# Altium integrated library AnalogDevices.IntLib: 130 symbols (part 4 of 4)
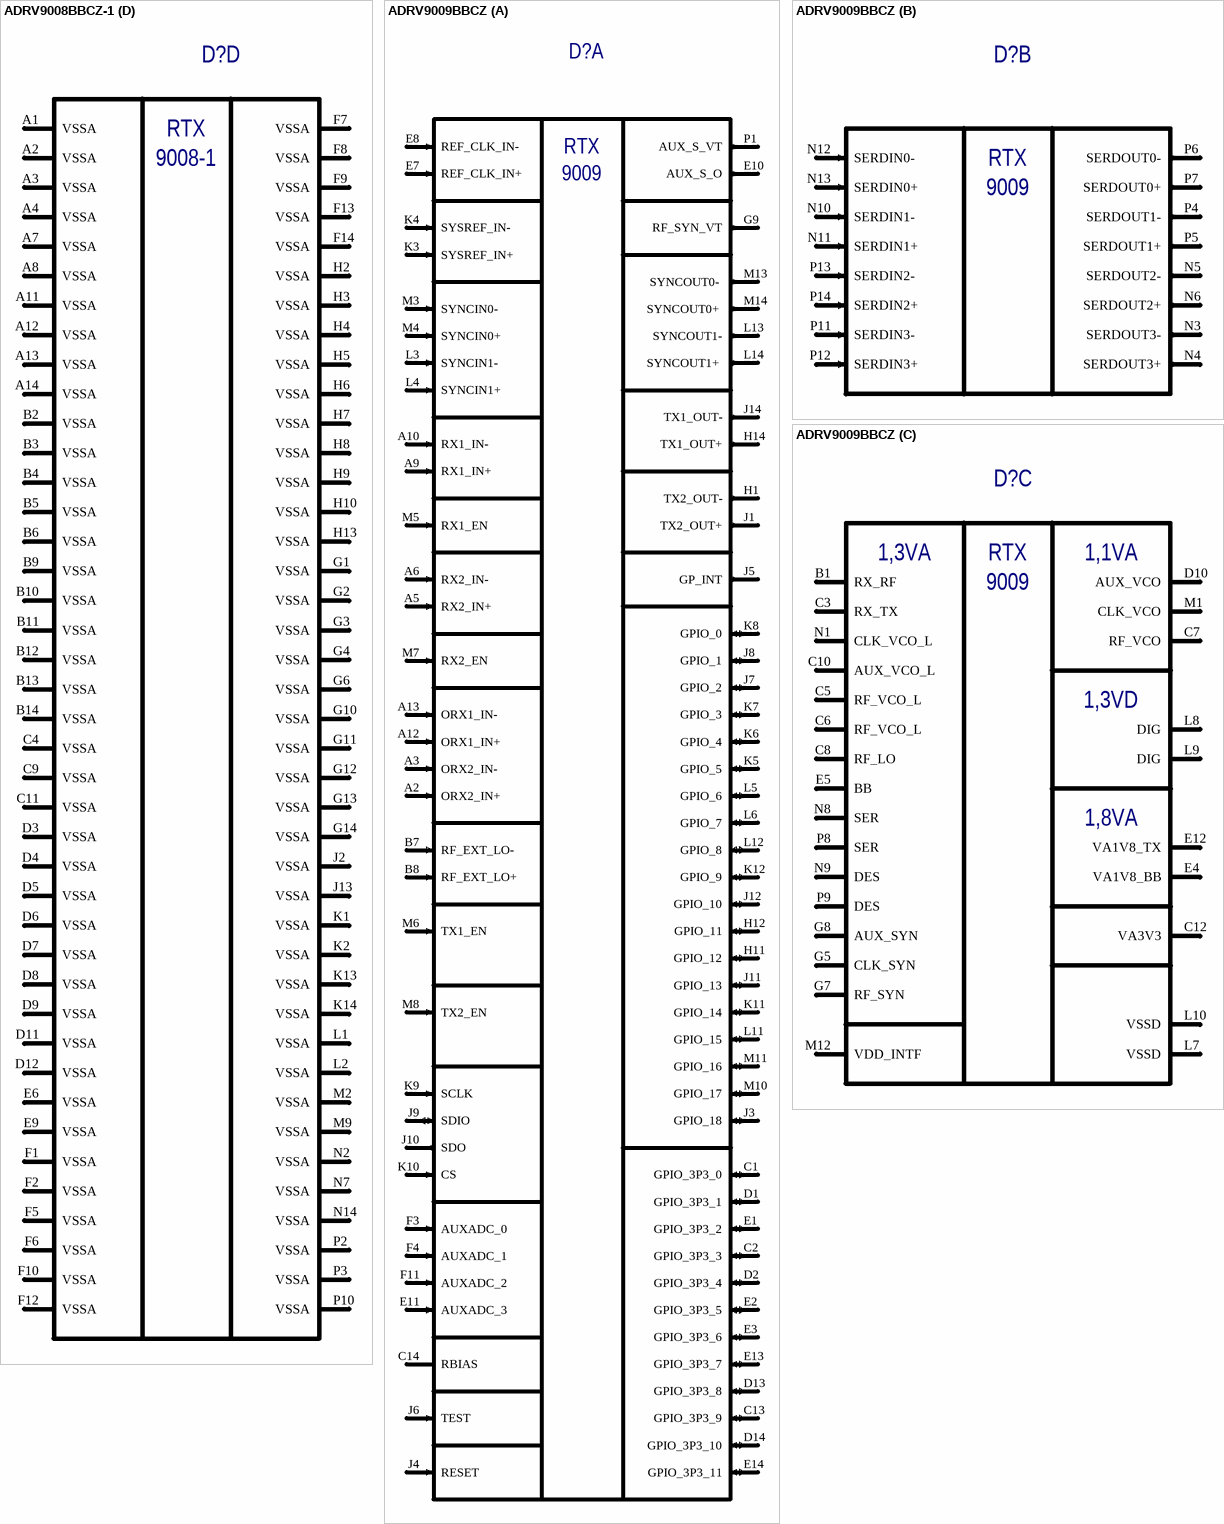
[diagram p24: symbols ADRV9008BBCZ-1 to ADRV9009BBCZ]

## ADRV9008BBCZ-1
designator D?  (value not drawn)
Integrated Dual RF Receivers; Manufacturer: Analog Devices; Type: Микросхема; SymAuthor: Ерешко П.А.; Package: BC-196-13; ManufacturerPartNumber: ADRV9008BBCZ-1
footprint BGA196C80P12X12_1200X1200X127 (BGA, 196-Leads, Body 12,00x12,00mmx1,27mm, Pitch 0,80mm)
part A pins: A5 RX2_IN+ (in) "Differential Input for Main Receiver 2.", A6 RX2_IN- (in) "Differential Input for Main Receiver 2.", A9 RX1_IN+ (in) "Differential Input for Main Receiver 1.", A10 RX1_IN- (in) "Differential Input for Main Receiver 1.", B7 RF_EXT_LO- (in) "Differential External LO Input/Output.", B8 RF_EXT_LO+ (in) "Differential External LO Input/Output.", C1 GPIO_3P3_0 (io) "GPIO Pin Referenced to 3.3 V Supply. The alternate function is AUXDAC_4.", C2 GPIO_3P3_3 (io) "GPIO Pin Referenced to 3.3 V Supply.", C13 GPIO_3P3_9 (io) "GPIO Pin Referenced to 3.3 V Supply. The alternative function is AUXDAC_9.", C14 RBIAS "Bias Resistor. Tie this pin to ground using a 14.3 kOhm resistor. This pin generates an internal current based on an external 1% resistor.", D1 GPIO_3P3_1 (io) "GPIO Pin Referenced to 3.3 V Supply. The alternative function is AUXDAC_5.", D2 GPIO_3P3_4 (io) "GPIO Pin Referenced to 3.3 V Supply. The alternative function is AUXDAC_6.", D13 GPIO_3P3_8 (io) "GPIO Pin Referenced to 3.3 V Supply. The alternative function is AUXDAC_1.", D14 GPIO_3P3_10 (io) "GPIO Pin Referenced to 3.3 V Supply. The alternative function is AUXDAC_0.", E1 GPIO_3P3_2 (io) "GPIO Pin Referenced to 3.3 V Supply.", E2 GPIO_3P3_5 (io) "GPIO Pin Referenced to 3.3 V Supply. The alternative function is AUXDAC_7.", E3 GPIO_3P3_6 (io) "GPIO Pin Referenced to 3.3 V Supply. The alternative function is AUXDAC_8.", E7 REF_CLK_IN+ (in) "Device Clock Differential Input.", E8 REF_CLK_IN- (in) "Device Clock Differential Input.", E10 AUX_S_O (out) "Auxiliary PLL Output.", E11 AUXADC_3 (in) "Auxiliary ADC Input.", E13 GPIO_3P3_7 (io) "GPIO Pin Referenced to 3.3 V Supply. The alternative function is AUXDAC_2.", E14 GPIO_3P3_11 (io) "GPIO Pin Referenced to 3.3 V Supply. The alternative function is AUXDAC_3.", F3 AUXADC_0 (in) "Auxiliary ADC Input.", F4 AUXADC_1 (in) "Auxiliary ADC Input.", F11 AUXADC_2 (in) "Auxiliary ADC Input.", G9 RF_SYN_VT (out) "RF Synthesizer VTUNE Output.", H11 GPIO_12 (io) "Digital GPIO 1.8 V to 2.5 V.", H12 GPIO_11 (io) "Digital GPIO 1.8 V to 2.5 V.", J3 GPIO_18 (io) "Digital GPIO 1.8 V to 2.5 V. The joint test action group (JTAG) function is TCLK.", J4 ~{RESET} (in) "Active Low Chip Reset.", J5 GP_INT (out) "General-Purpose Digital Interrupt Output Signal.", J6 TEST (in) "Pin Used for JTAG Boundary Scan.", J7 GPIO_2 (io) "Digital GPIO 1.8 V to 2.5 V.", J8 GPIO_1 (io) "Digital GPIO 1.8 V to 2.5 V.", J9 SDIO (io) "Serial Data Input in 4-Wire Mode or Input/Output in 3-Wire Mode.", J10 SDO (out) "Serial Data Output.", J11 GPIO_13 (io) "Digital GPIO 1.8 V to 2.5 V.", J12 GPIO_10 (io) "Digital GPIO 1.8 V to 2.5 V.", K3 SYSREF_IN+ (in) "LVDS Input.", K4 SYSREF_IN- (in) "LVDS Input.", K5 GPIO_5 (io) "Digital GPIO 1.8 V to 2.5 V. The JTAG function is TDO.", K6 GPIO_4 (io) "Digital GPIO 1.8 V to 2.5 V. The JTAG function is TRST.", K7 GPIO_3 (io) "Digital GPIO 1.8 V to 2.5 V.", K8 GPIO_0 (io) "Digital GPIO 1.8 V to 2.5 V.", K9 SCLK (in) "Serial Data Bus Clock.", K10 ~{CS} (in) "Serial Data Bus Chip Select.", K11 GPIO_14 (io) "Digital GPIO 1.8 V to 2.5 V.", K12 GPIO_9 (io) "Digital GPIO 1.8 V to 2.5 V.", L3 ~{SYNCIN1}- (in) "LVDS Input. These pins form the sync signal associated with receiver channel data on the JESD204B interface.", L4 ~{SYNCIN1}+ (in) "LVDS Input. These pins form the sync signal associated with receiver channel data on the JESD204B interface.", L5 GPIO_6 (io) "Digital GPIO 1.8 V to 2.5 V. The JTAG function is TDI.", L6 GPIO_7 (io) "Digital GPIO 1.8 V to 2.5 V. The JTAG function is TMS.", L11 GPIO_15 (io) "Digital GPIO 1.8 V to 2.5 V.", L12 GPIO_8 (io) "Digital GPIO 1.8 V to 2.5 V.", M3 ~{SYNCIN0}- (in) "LVDS Input. These pins form the sync signal associated with receiver channel data on the JESD204B interface.", M4 ~{SYNCIN0}+ (in) "LVDS Input. These pins form the sync signal associated with receiver channel data on the JESD204B interface.", M5 RX1_EN (in) "Receiver 1 Enable Pin.", M7 RX2_EN (in) "Receiver 2 Enable Pin.", M10 GPIO_17 (io) "Digital GPIO 1.8 V to 2.5 V.", M11 GPIO_16 (io) "Digital GPIO 1.8 V to 2.5 V.", P1 AUX_S_VT (out) "Auxiliary Synthesizer VTUNE Output."
part B pins: L13 1,3V_SER (power) "1.3 V Supply for JESD204B Serializer.", L14 1,3V_SER (power) "1.3 V Supply for JESD204B Serializer.", M13 1,3V_SER (power) "1.3 V Supply for JESD204B Serializer.", M14 1,3V_SER (power) "1.3 V Supply for JESD204B Serializer.", N3 SERDOUT3- (out) "RF Current Mode Logic (CML) Differential Output 3.", N4 SERDOUT3+ (out) "RF Current Mode Logic (CML) Differential Output 3.", N5 SERDOUT2- (out) "RF CML Differential Output 2.", N6 SERDOUT2+ (out) "RF CML Differential Output 2.", N8 1,3V_SER (power) "1.3 V Supply for JESD204B Serializer.", N9 1,3V_SER (power) "1.3 V Supply for JESD204B Serializer.", N10 1,3V_SER (power) "1.3 V Supply for JESD204B Serializer.", N11 1,3V_SER (power) "1.3 V Supply for JESD204B Serializer.", N12 1,3V_SER (power) "1.3 V Supply for JESD204B Serializer.", N13 1,3V_SER (power) "1.3 V Supply for JESD204B Serializer.", P4 SERDOUT1- (out) "RF CML Differential Output 1.", P5 SERDOUT1+ (out) "RF CML Differential Output 1.", P6 SERDOUT0- (out) "RF CML Differential Output 0.", P7 SERDOUT0+ (out) "RF CML Differential Output 0.", P8 1,3V_SER (power) "1.3 V Supply for JESD204B Serializer.", P9 1,3V_SER (power) "1.3 V Supply for JESD204B Serializer.", P11 1,3V_SER (power) "1.3 V Supply for JESD204B Serializer.", P12 1,3V_SER (power) "1.3 V Supply for JESD204B Serializer.", P13 1,3V_SER (power) "1.3 V Supply for JESD204B Serializer.", P14 1,3V_SER (power) "1.3 V Supply for JESD204B Serializer."
part C pins: B1 RX_RF (power) "Receiver Mixer Supply", C3 RX (power) "1.3 V Supply for Receiver Baseband Circuits and Transimpedance Amplifier (TIA) and Baseband Filters and Auxiliary DACs.", C5 RF_VCO_L (power) "RF VCO LDO Supply Inputs. Connect Pin C5 to Pin C6. Use a separate trace on the PCB back to a common supply point.", C6 RF_VCO_L (power) "RF VCO LDO Supply Inputs. Connect Pin C5 to Pin C6. Use a separate trace on the PCB back to a common supply point.", C7 RF_VCO (power) "1.1 V VCO Supply. Decouple this pin with 1 µF.", C8 RF_LO (power) "1.3 V LO Generator for the RF Synthesizer. This pin is sensitive to supply noise.", C10 AUX_VCO_L (power) "1.3 V Supply.", C12 VA3V3 (power) "General-Purpose Output Pull-Up Voltage and Auxiliary DAC Supply Voltage.", D10 AUX_VCO (power) "1.1 V VCO Supply. Decouple this pin with 1 µF.", E4 VA1V8_BB (power) "1.8 V Supply for the ADC and DAC.", E5 VA1V3_BB (power) "1.3 V Supply for the ADC and DAC and AUXADC.", E12 VA1V8_AN (power) "1.8 V Supply for Analog Circuitry", G5 CLK_SYN (power) "1.3 V Supply Input for Clock Synthesizer. Use a separate trace on the PCB back to a common supply point.", G7 RF_SYN (power) "1.3 V RF Synthesizer Supply Input. This pin is sensitive to supply noise.", G8 AUX_SYN (power) "1.3 V Auxiliary Synthesizer Supply Input.", L7 VSSD (power) "Digital VSS.", L8 DIG (power) "1.3 V Digital Core. Connect Pin L8 and Pin L9 together. Use a wide trace to connect to a separate power supply domain.", L9 DIG (power) "1.3 V Digital Core. Connect Pin L8 and Pin L9 together. Use a wide trace to connect to a separate power supply domain.", L10 VSSD (power) "Digital VSS.", M1 CLK_VCO (power) "1.1 V VCO Supply. Decouple this pin with 1 µF.", M6 VSSD (in) "Digital VSS.", M8 VSSD (in) "Digital VSS.", M12 VDD_INTF (power) "IO Interface Supply 1.8 V to 2.5 V.", N1 CLK_VCO_L (power) "1.3 V Use Separate Trace to Common Supply Point."
part D pins: A1 VSSA (power) "Analog Supply Voltage (VSS)", A2 VSSA (power) "Analog Supply Voltage (VSS)", A3 VSSA (power) "Analog Supply Voltage (VSS)", A4 VSSA (power) "Analog Supply Voltage (VSS)", A7 VSSA (power) "Analog Supply Voltage (VSS)", A8 VSSA (power) "Analog Supply Voltage (VSS)", A11 VSSA (power) "Analog Supply Voltage (VSS)", A12 VSSA (power) "Analog Supply Voltage (VSS)", A13 VSSA (power) "Analog Supply Voltage (VSS)", A14 VSSA (power) "Analog Supply Voltage (VSS)", B2 VSSA (power) "Analog Supply Voltage (VSS)", B3 VSSA (power) "Analog Supply Voltage (VSS)", B4 VSSA (power) "Analog Supply Voltage (VSS)", B5 VSSA (power) "Analog Supply Voltage (VSS)", B6 VSSA (power) "Analog Supply Voltage (VSS)", B9 VSSA (power) "Analog Supply Voltage (VSS)", B10 VSSA (power) "Analog Supply Voltage (VSS)", B11 VSSA (power) "Analog Supply Voltage (VSS)", B12 VSSA (power) "Analog Supply Voltage (VSS)", B13 VSSA (power) "Analog Supply Voltage (VSS)", B14 VSSA (power) "Analog Supply Voltage (VSS)", C4 VSSA (power) "Analog Supply Voltage (VSS)", C9 VSSA (power) "Analog Supply Voltage (VSS)", C11 VSSA (power) "Analog Supply Voltage (VSS)", D3 VSSA (power) "Analog Supply Voltage (VSS)", D4 VSSA (power) "Analog Supply Voltage (VSS)", D5 VSSA (power) "Analog Supply Voltage (VSS)", D6 VSSA (power) "Analog Supply Voltage (VSS)", D7 VSSA (power) "Analog Supply Voltage (VSS)", D8 VSSA (power) "Analog Supply Voltage (VSS)", D9 VSSA (power) "Analog Supply Voltage (VSS)", D11 VSSA (power) "Analog Supply Voltage (VSS)", D12 VSSA (power) "Analog Supply Voltage (VSS)", E6 VSSA (power) "Analog Supply Voltage (VSS)", E9 VSSA (power) "Analog Supply Voltage (VSS)", F1 VSSA (power) "Analog Supply Voltage (VSS)", F2 VSSA (power) "Analog Supply Voltage (VSS)", F5 VSSA (power) "Analog Supply Voltage (VSS)", F6 VSSA (power) "Analog Supply Voltage (VSS)", F7 VSSA (power) "Analog Supply Voltage (VSS)", F8 VSSA (power) "Analog Supply Voltage (VSS)", F9 VSSA (power) "Analog Supply Voltage (VSS)", F10 VSSA (power) "Analog Supply Voltage (VSS)", F12 VSSA (power) "Analog Supply Voltage (VSS)", F13 VSSA (power) "Analog Supply Voltage (VSS)", F14 VSSA (power) "Analog Supply Voltage (VSS)", G1 VSSA (power) "Analog Supply Voltage (VSS)", G2 VSSA (power) "Analog Supply Voltage (VSS)", G3 VSSA (power) "Analog Supply Voltage (VSS)", G4 VSSA (power) "Analog Supply Voltage (VSS)", G6 VSSA (power) "Analog Supply Voltage (VSS)", G10 VSSA (power) "Analog Supply Voltage (VSS)", G11 VSSA (power) "Analog Supply Voltage (VSS)", G12 VSSA (power) "Analog Supply Voltage (VSS)", G13 VSSA (power) "Analog Supply Voltage (VSS)", G14 VSSA (power) "Analog Supply Voltage (VSS)", H2 VSSA (power) "Analog Supply Voltage (VSS)", H3 VSSA (power) "Analog Supply Voltage (VSS)", H4 VSSA (power) "Analog Supply Voltage (VSS)", H5 VSSA (power) "Analog Supply Voltage (VSS)", H6 VSSA (power) "Analog Supply Voltage (VSS)", H7 VSSA (power) "Analog Supply Voltage (VSS)", H8 VSSA (power) "Analog Supply Voltage (VSS)", H9 VSSA (power) "Analog Supply Voltage (VSS)", H10 VSSA (power) "Analog Supply Voltage (VSS)", H13 VSSA (power) "Analog Supply Voltage (VSS)", J2 VSSA (power) "Analog Supply Voltage (VSS)", J13 VSSA (power) "Analog Supply Voltage (VSS)", K1 VSSA (power) "Analog Supply Voltage (VSS)", K2 VSSA (power) "Analog Supply Voltage (VSS)", K13 VSSA (power) "Analog Supply Voltage (VSS)", K14 VSSA (power) "Analog Supply Voltage (VSS)", L1 VSSA (power) "Analog Supply Voltage (VSS)", L2 VSSA (power) "Analog Supply Voltage (VSS)", M2 VSSA (power) "Analog Supply Voltage (VSS)", M9 VSSA (power) "Analog Supply Voltage (VSS)", N2 VSSA (power) "Analog Supply Voltage (VSS)", N7 VSSA (power) "Analog Supply Voltage (VSS)", N14 VSSA (power) "Analog Supply Voltage (VSS)", P2 VSSA (power) "Analog Supply Voltage (VSS)", P3 VSSA (power) "Analog Supply Voltage (VSS)", P10 VSSA (power) "Analog Supply Voltage (VSS)"
part A text: RTX; 9008-1
part B text: VDDA; RTX; 9008-1
part C text: 1,3VA; RTX; 1,1VA; 9008-1; 1,3VD; 1,8VA
part D text: RTX; 9008-1

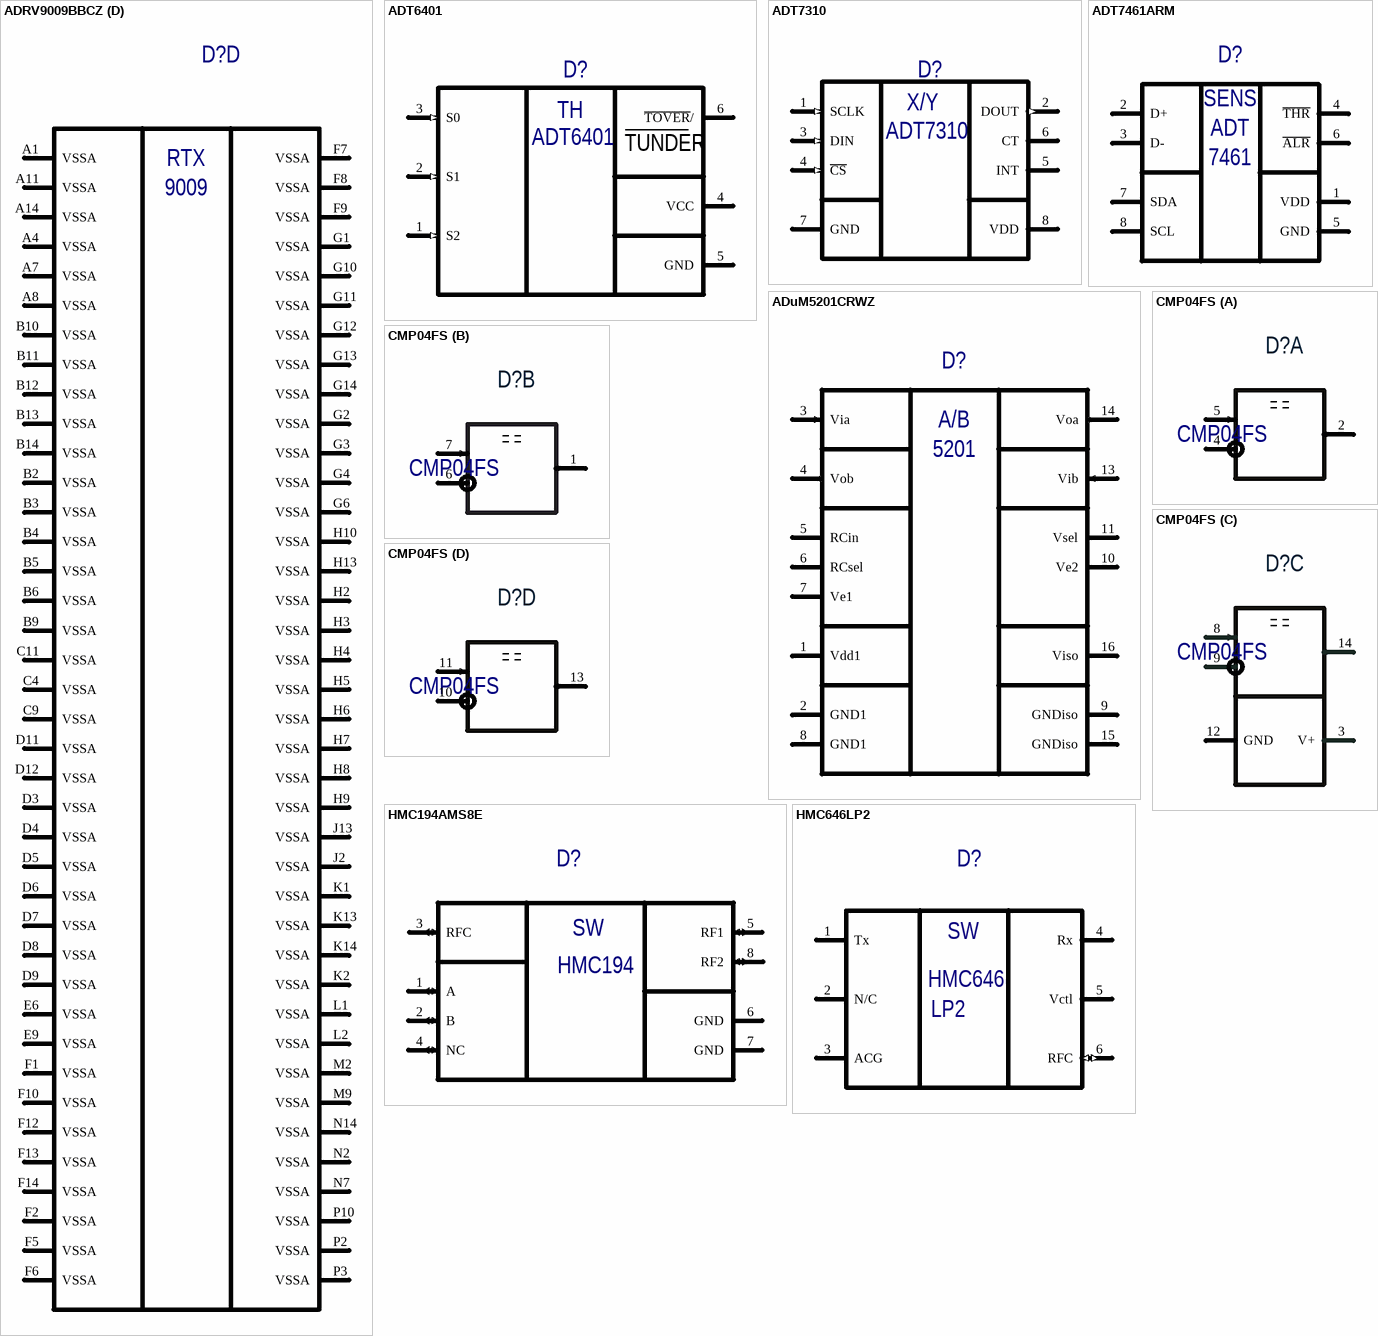
[diagram p18: symbols ADRV9009BBCZ to HMC646LP2]

## ADRV9009BBCZ
designator D?  (value not drawn)
14Vin, 4A Step-Down DC/DC µModule Regulator; Manufacturer: Analog Devices; Type: Микросхема; SymAuthor: Ерешко П.А.; Package: BC-196-13; ManufacturerPartNumber: ADRV9009BBCZ
footprint BGA196C80P12X12_1200X1200X127 (BGA, 196-Leads, Body 12,00x12,00mmx1,27mm, Pitch 0,80mm)
part A pins: A2 ORX2_IN+ (in) "Differential Input for Observation Receiver 2.", A3 ORX2_IN- (in) "Differential Input for Observation Receiver 2.", A5 RX2_IN+ (in) "Differential Input for Main Receiver 2.", A6 RX2_IN- (in) "Differential Input for Main Receiver 2.", A9 RX1_IN+ (in) "Differential Input for Main Receiver 1.", A10 RX1_IN- (in) "Differential Input for Main Receiver 1.", A12 ORX1_IN+ (in) "Differential Input for Observation Receiver 1.", A13 ORX1_IN- (in) "Differential Input for Observation Receiver 1.", B7 RF_EXT_LO- (in) "Differential External LO Input/Output.", B8 RF_EXT_LO+ (in) "Differential External LO Input/Output.", C1 GPIO_3P3_0 (io) "GPIO Pin Referenced to 3.3 V Supply. The alternate function is AUXDAC_4.", C2 GPIO_3P3_3 (io) "GPIO Pin Referenced to 3.3 V Supply.", C13 GPIO_3P3_9 (io) "GPIO Pin Referenced to 3.3 V Supply. The alternative function is AUXDAC_9.", C14 RBIAS "Bias Resistor. Tie this pin to ground using a 14.3 kOhm resistor. This pin generates an internal current based on an external 1% resistor.", D1 GPIO_3P3_1 (io) "GPIO Pin Referenced to 3.3 V Supply. The alternative function is AUXDAC_5.", D2 GPIO_3P3_4 (io) "GPIO Pin Referenced to 3.3 V Supply. The alternative function is AUXDAC_6.", D13 GPIO_3P3_8 (io) "GPIO Pin Referenced to 3.3 V Supply. The alternative function is AUXDAC_1.", D14 GPIO_3P3_10 (io) "GPIO Pin Referenced to 3.3 V Supply. The alternative function is AUXDAC_0.", E1 GPIO_3P3_2 (io) "GPIO Pin Referenced to 3.3 V Supply.", E2 GPIO_3P3_5 (io) "GPIO Pin Referenced to 3.3 V Supply. The alternative function is AUXDAC_7.", E3 GPIO_3P3_6 (io) "GPIO Pin Referenced to 3.3 V Supply. The alternative function is AUXDAC_8.", E7 REF_CLK_IN+ (in) "Device Clock Differential Input.", E8 REF_CLK_IN- (in) "Device Clock Differential Input.", E10 AUX_S_O (out) "Auxiliary PLL Output.", E11 AUXADC_3 (in) "Auxiliary ADC Input.", E13 GPIO_3P3_7 (io) "GPIO Pin Referenced to 3.3 V Supply. The alternative function is AUXDAC_2.", E14 GPIO_3P3_11 (io) "GPIO Pin Referenced to 3.3 V Supply. The alternative function is AUXDAC_3.", F3 AUXADC_0 (in) "Auxiliary ADC Input.", F4 AUXADC_1 (in) "Auxiliary ADC Input.", F11 AUXADC_2 (in) "Auxiliary ADC Input.", G9 RF_SYN_VT (out) "RF Synthesizer VTUNE Output.", H1 TX2_OUT- (out) "Transmitter 2 Output.", H11 GPIO_12 (io) "Digital GPIO 1.8 V to 2.5 V.", H12 GPIO_11 (io) "Digital GPIO 1.8 V to 2.5 V.", H14 TX1_OUT+ (out) "Transmitter 1 Output.", J1 TX2_OUT+ (out) "Transmitter 2 Output.", J3 GPIO_18 (io) "Digital GPIO 1.8 V to 2.5 V. The joint test action group (JTAG) function is TCLK.", J4 RESET (in) "Active Low Chip Reset.", J5 GP_INT (out) "General-Purpose Digital Interrupt Output Signal.", J6 TEST (in) "Pin Used for JTAG Boundary Scan.", J7 GPIO_2 (io) "Digital GPIO 1.8 V to 2.5 V.", J8 GPIO_1 (io) "Digital GPIO 1.8 V to 2.5 V.", J9 SDIO (io) "Serial Data Input in 4-Wire Mode or Input/Output in 3-Wire Mode.", J10 SDO (out) "Serial Data Output.", J11 GPIO_13 (io) "Digital GPIO 1.8 V to 2.5 V.", J12 GPIO_10 (io) "Digital GPIO 1.8 V to 2.5 V.", J14 TX1_OUT- (out) "Transmitter 1 Output.", K3 SYSREF_IN+ (in) "LVDS Input.", K4 SYSREF_IN- (in) "LVDS Input.", K5 GPIO_5 (io) "Digital GPIO 1.8 V to 2.5 V. The JTAG function is TDO.", K6 GPIO_4 (io) "Digital GPIO 1.8 V to 2.5 V. The JTAG function is TRST.", K7 GPIO_3 (io) "Digital GPIO 1.8 V to 2.5 V.", K8 GPIO_0 (io) "Digital GPIO 1.8 V to 2.5 V.", K9 SCLK (in) "Serial Data Bus Clock.", K10 CS (in) "Serial Data Bus Chip Select.", K11 GPIO_14 (io) "Digital GPIO 1.8 V to 2.5 V.", K12 GPIO_9 (io) "Digital GPIO 1.8 V to 2.5 V.", L3 SYNCIN1- (in) "LVDS Input. These pins form the sync signal associated with receiver channel data on the JESD204B interface.", L4 SYNCIN1+ (in) "LVDS Input. These pins form the sync signal associated with receiver channel data on the JESD204B interface.", L5 GPIO_6 (io) "Digital GPIO 1.8 V to 2.5 V. The JTAG function is TDI.", L6 GPIO_7 (io) "Digital GPIO 1.8 V to 2.5 V. The JTAG function is TMS.", L11 GPIO_15 (io) "Digital GPIO 1.8 V to 2.5 V.", L12 GPIO_8 (io) "Digital GPIO 1.8 V to 2.5 V.", L13 SYNCOUT1- (out) "LVDS Output. These pins form the sync signal associated with transmitter channel data on the JESD204B interface.", L14 SYNCOUT1+  (out) "LVDS Output. These pins form the sync signal associated with transmitter channel data on the JESD204B interface.", M3 SYNCIN0- (in) "LVDS Input. These pins form the sync signal associated with receiver channel data on the JESD204B interface.", M4 SYNCIN0+ (in) "LVDS Input. These pins form the sync signal associated with receiver channel data on the JESD204B interface.", M5 RX1_EN (in) "Receiver 1 Enable Pin.", M6 TX1_EN (in) "Transmitter 1 Enable Pin.", M7 RX2_EN (in) "Receiver 2 Enable Pin.", M8 TX2_EN (in) "Transmitter 2 Enable Pin.", M10 GPIO_17 (io) "Digital GPIO 1.8 V to 2.5 V.", M11 GPIO_16 (io) "Digital GPIO 1.8 V to 2.5 V.", M13 SYNCOUT0-  (out) "LVDS Output. These pins form the sync signal associated with transmitter channel data on the JESD204B interface.", M14 SYNCOUT0+  (out) "LVDS Output. These pins form the sync signal associated with transmitter channel data on the JESD204B interface.", P1 AUX_S_VT (out) "Auxiliary Synthesizer VTUNE Output."
part B pins: N3 SERDOUT3- (out) "RF Current Mode Logic (CML) Differential Output 3.", N4 SERDOUT3+ (out) "RF Current Mode Logic (CML) Differential Output 3.", N5 SERDOUT2- (out) "RF CML Differential Output 2.", N6 SERDOUT2+ (out) "RF CML Differential Output 2.", N10 SERDIN1- (in) "RF CML Differential Input 1.", N11 SERDIN1+ (in) "RF CML Differential Input 1.", N12 SERDIN0- (in) "RF CML Differential Input 0.", N13 SERDIN0+ (in) "RF CML Differential Input 0.", P4 SERDOUT1- (out) "RF CML Differential Output 1.", P5 SERDOUT1+ (out) "RF CML Differential Output 1.", P6 SERDOUT0- (out) "RF CML Differential Output 0.", P7 SERDOUT0+ (out) "RF CML Differential Output 0.", P11 SERDIN3- (in) "RF CML Differential Input 3.", P12 SERDIN3+ (in) "RF CML Differential Input 3.", P13 SERDIN2- (in) "RF CML Differential Input 2.", P14 SERDIN2+ (in) "RF CML Differential Input 2."
part C pins: B1 RX_RF (power) "Observation Receiver Supply.", C3 RX_TX (power) "1.3 V Supply for Transmitter/Receiver Baseband Circuits and Transimpedance Amplifier (TIA) and Transmitter Transconductance (GM) and Baseband Filters and Auxiliary DACs.", C5 RF_VCO_L (power) "RF VCO LDO Supply Inputs. Connect Pin C5 to Pin C6. Use a separate trace on the PCB back to a common supply point.", C6 RF_VCO_L (power) "RF VCO LDO Supply Inputs. Connect Pin C5 to Pin C6. Use a separate trace on the PCB back to a common supply point.", C7 RF_VCO (power) "1.1 V VCO Supply. Decouple this pin with 1 µF.", C8 RF_LO (power) "1.3 V LO Generator for the RF Synthesizer. This pin is sensitive to supply noise.", C10 AUX_VCO_L (power) "1.3 V Supply.", C12 VA3V3 (power) "General-Purpose Output Pull-Up Voltage and Auxiliary DAC Supply Voltage.", D10 AUX_VCO (power) "1.1 V VCO Supply. Decouple this pin with 1 µF.", E4 VA1V8_BB (power) "1.8 V Supply for the ADC and DAC.", E5 BB (power) "1.3 V Supply for the ADC and DAC and AUXADC.", E12 VA1V8_TX (power) "1.8 V Supply for Transmitter.", G5 CLK_SYN (power) "1.3 V Supply Input for Clock Synthesizer. Use a separate trace on the PCB back to a common supply point.", G7 RF_SYN (power) "1.3 V RF Synthesizer Supply Input. This pin is sensitive to supply noise.", G8 AUX_SYN (power) "1.3 V Auxiliary Synthesizer Supply Input.", L7 VSSD (power) "Digital VSS.", L8 DIG (power) "1.3 V Digital Core. Connect Pin L8 and Pin L9 together. Use a wide trace to connect to a separate power supply domain.", L9 DIG (power) "1.3 V Digital Core. Connect Pin L8 and Pin L9 together. Use a wide trace to connect to a separate power supply domain.", L10 VSSD (power) "Digital VSS.", M1 CLK_VCO (power) "1.1 V VCO Supply. Decouple this pin with 1 µF.", M12 VDD_INTF (power) "IO Interface Supply 1.8 V to 2.5 V.", N1 CLK_VCO_L (power) "1.3 V Use Separate Trace to Common Supply Point.", N8 SER (power) "1.3 V Supply for JESD204B Serializer.", N9 DES (power) "1.3 V Supply for JESD204B Deserializer.", P8 SER (power) "1.3 V Supply for JESD204B Serializer.", P9 DES (power) "1.3 V Supply for JESD204B Deserializer."
part D pins: A1 VSSA (power) "Analog Supply Voltage (VSS ).", A4 VSSA (power) "Analog Supply Voltage (VSS ).", A7 VSSA (power) "Analog Supply Voltage (VSS ).", A8 VSSA (power) "Analog Supply Voltage (VSS ).", A11 VSSA (power) "Analog Supply Voltage (VSS ).", A14 VSSA (power) "Analog Supply Voltage (VSS ).", B2 VSSA (power) "Analog Supply Voltage (VSS ).", B3 VSSA (power) "Analog Supply Voltage (VSS ).", B4 VSSA (power) "Analog Supply Voltage (VSS ).", B5 VSSA (power) "Analog Supply Voltage (VSS ).", B6 VSSA (power) "Analog Supply Voltage (VSS ).", B9 VSSA (power) "Analog Supply Voltage (VSS ).", B10 VSSA (power) "Analog Supply Voltage (VSS ).", B11 VSSA (power) "Analog Supply Voltage (VSS ).", B12 VSSA (power) "Analog Supply Voltage (VSS ).", B13 VSSA (power) "Analog Supply Voltage (VSS ).", B14 VSSA (power) "Analog Supply Voltage (VSS ).", C4 VSSA (power) "Analog Supply Voltage (VSS ).", C9 VSSA (power) "Analog Supply Voltage (VSS ).", C11 VSSA (power) "Analog Supply Voltage (VSS ).", D3 VSSA (power) "Analog Supply Voltage (VSS ).", D4 VSSA (power) "Analog Supply Voltage (VSS ).", D5 VSSA (power) "Analog Supply Voltage (VSS ).", D6 VSSA (power) "Analog Supply Voltage (VSS ).", D7 VSSA (power) "Analog Supply Voltage (VSS ).", D8 VSSA (power) "Analog Supply Voltage (VSS ).", D9 VSSA (power) "Analog Supply Voltage (VSS ).", D11 VSSA (power) "Analog Supply Voltage (VSS ).", D12 VSSA (power) "Analog Supply Voltage (VSS ).", E6 VSSA (power) "Analog Supply Voltage (VSS ).", E9 VSSA (power) "Analog Supply Voltage (VSS ).", F1 VSSA (power) "Analog Supply Voltage (VSS ).", F2 VSSA (power) "Analog Supply Voltage (VSS ).", F5 VSSA (power) "Analog Supply Voltage (VSS ).", F6 VSSA (power) "Analog Supply Voltage (VSS ).", F7 VSSA (power) "Analog Supply Voltage (VSS ).", F8 VSSA (power) "Analog Supply Voltage (VSS ).", F9 VSSA (power) "Analog Supply Voltage (VSS ).", F10 VSSA (power) "Analog Supply Voltage (VSS ).", F12 VSSA (power) "Analog Supply Voltage (VSS ).", F13 VSSA (power) "Analog Supply Voltage (VSS ).", F14 VSSA (power) "Analog Supply Voltage (VSS ).", G1 VSSA (power) "Analog Supply Voltage (VSS ).", G2 VSSA (power) "Analog Supply Voltage (VSS ).", G3 VSSA (power) "Analog Supply Voltage (VSS ).", G4 VSSA (power) "Analog Supply Voltage (VSS ).", G6 VSSA (power) "Analog Supply Voltage (VSS ).", G10 VSSA (power) "Analog Supply Voltage (VSS ).", G11 VSSA (power) "Analog Supply Voltage (VSS ).", G12 VSSA (power) "Analog Supply Voltage (VSS ).", G13 VSSA (power) "Analog Supply Voltage (VSS ).", G14 VSSA (power) "Analog Supply Voltage (VSS ).", H2 VSSA (power) "Analog Supply Voltage (VSS ).", H3 VSSA (power) "Analog Supply Voltage (VSS ).", H4 VSSA (power) "Analog Supply Voltage (VSS ).", H5 VSSA (power) "Analog Supply Voltage (VSS ).", H6 VSSA (power) "Analog Supply Voltage (VSS ).", H7 VSSA (power) "Analog Supply Voltage (VSS ).", H8 VSSA (power) "Analog Supply Voltage (VSS ).", H9 VSSA (power) "Analog Supply Voltage (VSS ).", H10 VSSA (power) "Analog Supply Voltage (VSS ).", H13 VSSA (power) "Analog Supply Voltage (VSS ).", J2 VSSA (power) "Analog Supply Voltage (VSS ).", J13 VSSA (power) "Analog Supply Voltage (VSS ).", K1 VSSA (power) "Analog Supply Voltage (VSS ).", K2 VSSA (power) "Analog Supply Voltage (VSS ).", K13 VSSA (power) "Analog Supply Voltage (VSS ).", K14 VSSA (power) "Analog Supply Voltage (VSS ).", L1 VSSA (power) "Analog Supply Voltage (VSS ).", L2 VSSA (power) "Analog Supply Voltage (VSS ).", M2 VSSA (power) "Analog Supply Voltage (VSS ).", M9 VSSA (power) "Analog Supply Voltage (VSS ).", N2 VSSA (power) "Analog Supply Voltage (VSS ).", N7 VSSA (power) "Analog Supply Voltage (VSS ).", N14 VSSA (power) "Analog Supply Voltage (VSS ).", P2 VSSA (power) "Analog Supply Voltage (VSS ).", P3 VSSA (power) "Analog Supply Voltage (VSS ).", P10 VSSA (power) "Analog Supply Voltage (VSS )."
part A text: RTX; 9009
part B text: RTX; 9009
part C text: 1,3VA; RTX; 1,1VA; 9009; 1,3VD; 1,8VA
part D text: RTX; 9009

## ADT6401
designator D?, comment ADT6401SRJZ-RL7  (value not drawn)
2.7 V to 5.5 V, Pin-Selectable  Temperature Switches in SOT-23; Manufacturer: Analog Devices, Inc.; Type: Микросхема; BCPId: *; Name: *; Package: 6-Lead SOT-23 ( RJ-6); ManufacturerPartNumber: ADT6401SRJZ-RL7
footprint SOT95P280X145-6N (SOT23, 6-Leads, Body 1,6x2,9mm, Pitch 0,95mm)
pins: 1 S2 (in) "Select Pin for Trip Point and Hysteresis Values", 2 S1 (in) "Select Pin for Trip Point and Hysteresis Values", 3 S0 (in) "Select Pin for Trip Point and Hysteresis Values", 4 VCC (power) "Supply Input", 5 GND (power), 6 ~{TOVER}/ (oc) "Open-Drain, Active Low Output"
text: TH; TUNDER

## ADT7310
designator D?, comment ADT7310TRZ  (value not drawn)
±0.5°C Accurate, 16-Bit  Digital SPI Temperature Sensor; Manufacturer: Analog Devices, Inc.; Type: Микросхема; BCPId: *; Name: *; Package: SOIC-8 (R-8); ManufacturerPartNumber: ADT7310TRZ
footprint SOIC127P600-8M (SOIC, 8-Leads, Body 4.9x3.9mm, Pitch 1.27mm, IPC Low Density)
pins: 1 SCLK (in) "Serial Clock Input", 2 DOUT (out) "Serial Data Output", 3 DIN (in) "Serial Data Input", 4 ~{CS} (in) "Chip Select Input", 5 INT (oc) "Overtemperature and Undertemperature Indicator. Logic output", 6 CT (oc) "Critical Overtemperature Indicator. Logic output", 7 GND (power), 8 VDD (power) "Positive Supply Voltage"
text: X/Y

## ADT7461ARM
designator D?  (value not drawn)
Устройство контроля температуры; Manufacturer: Analog Devices; Type: Микросхема; SymAuthor: Семенов В.С.; BCPId: *; ManufacturerPartNumber: ADT7461ARM; Package: RM-8
footprint TSOP65P490X110-8N (Shrink Small Outline; 8 Leads; Body Width 3 mm; Pitch 0.65 mm)
pins: 1 VDD "Питание", 2 D+ "Контакт положительной цепи датчика температуры", 3 D- "Контакт отрицательной цепи датчика температуры", 4 ~{THR} "Сигнал превышения уровня температуры", 5 GND "Земля", 6 ~{ALR}, 7 SDA "Шина данных последовательного интерфейса SMBus", 8 SCL "Шина тактирования последовательного интерфейса SMBus"
text: SENS; ADT; 7461

## ADuM5201CRWZ
designator D?  (value not drawn)
Dual-Channel, 2.5 kV Isolators with Integrated DC-to-DC Converter; Manufacturer: Analog Devices; Type: Микросхема; Package: 16-Lead SOIC_W; ManufacturerPartNumber: ADuM5201CRWZ
footprint SOP127P1030X265-16N (SOP, 16-Leads, Body 10,30x7,50mm, Pitch 1,27mm, IPC Medium Density)
pins: 1 Vdd1 (power) "Primary Supply Voltage, 3.0 V to 5.5 V", 2 GND1 (power) "Ground 1", 3 Via (in) "Logic Input A", 4 Vob (out) "Logic Output B", 5 RCin "Regulation Control Input", 6 RCsel "Control Input", 7 Ve1 "Data Enable Input", 8 GND1 (power) "Ground 1", 9 GNDiso (power) "Ground Reference for Isolator Side 2", 10 Ve2 "Data Enable Input", 11 Vsel "Output Voltage Selection", 12 NC hidden "No Internal Connection", 13 Vib (in) "Logic Input B", 14 Voa (out) "Logic Output A", 15 GNDiso (power) "Ground Reference for Isolator Side 2", 16 Viso (power) "Secondary Supply Voltage"